# Altium footprint library Supernova Connectors.PcbLib: 303 footprints (part 1 of 19)
Each footprint in its own frame and in the unit in brackets; x right, y up, seen from the top. Pads: shape width x height; smd on the part's side, far side on the other; paste and mask are expansions set on the pad; w line width, h text height; cw(c..) or ccw(c..) is an arc to the next point about the centre after c.
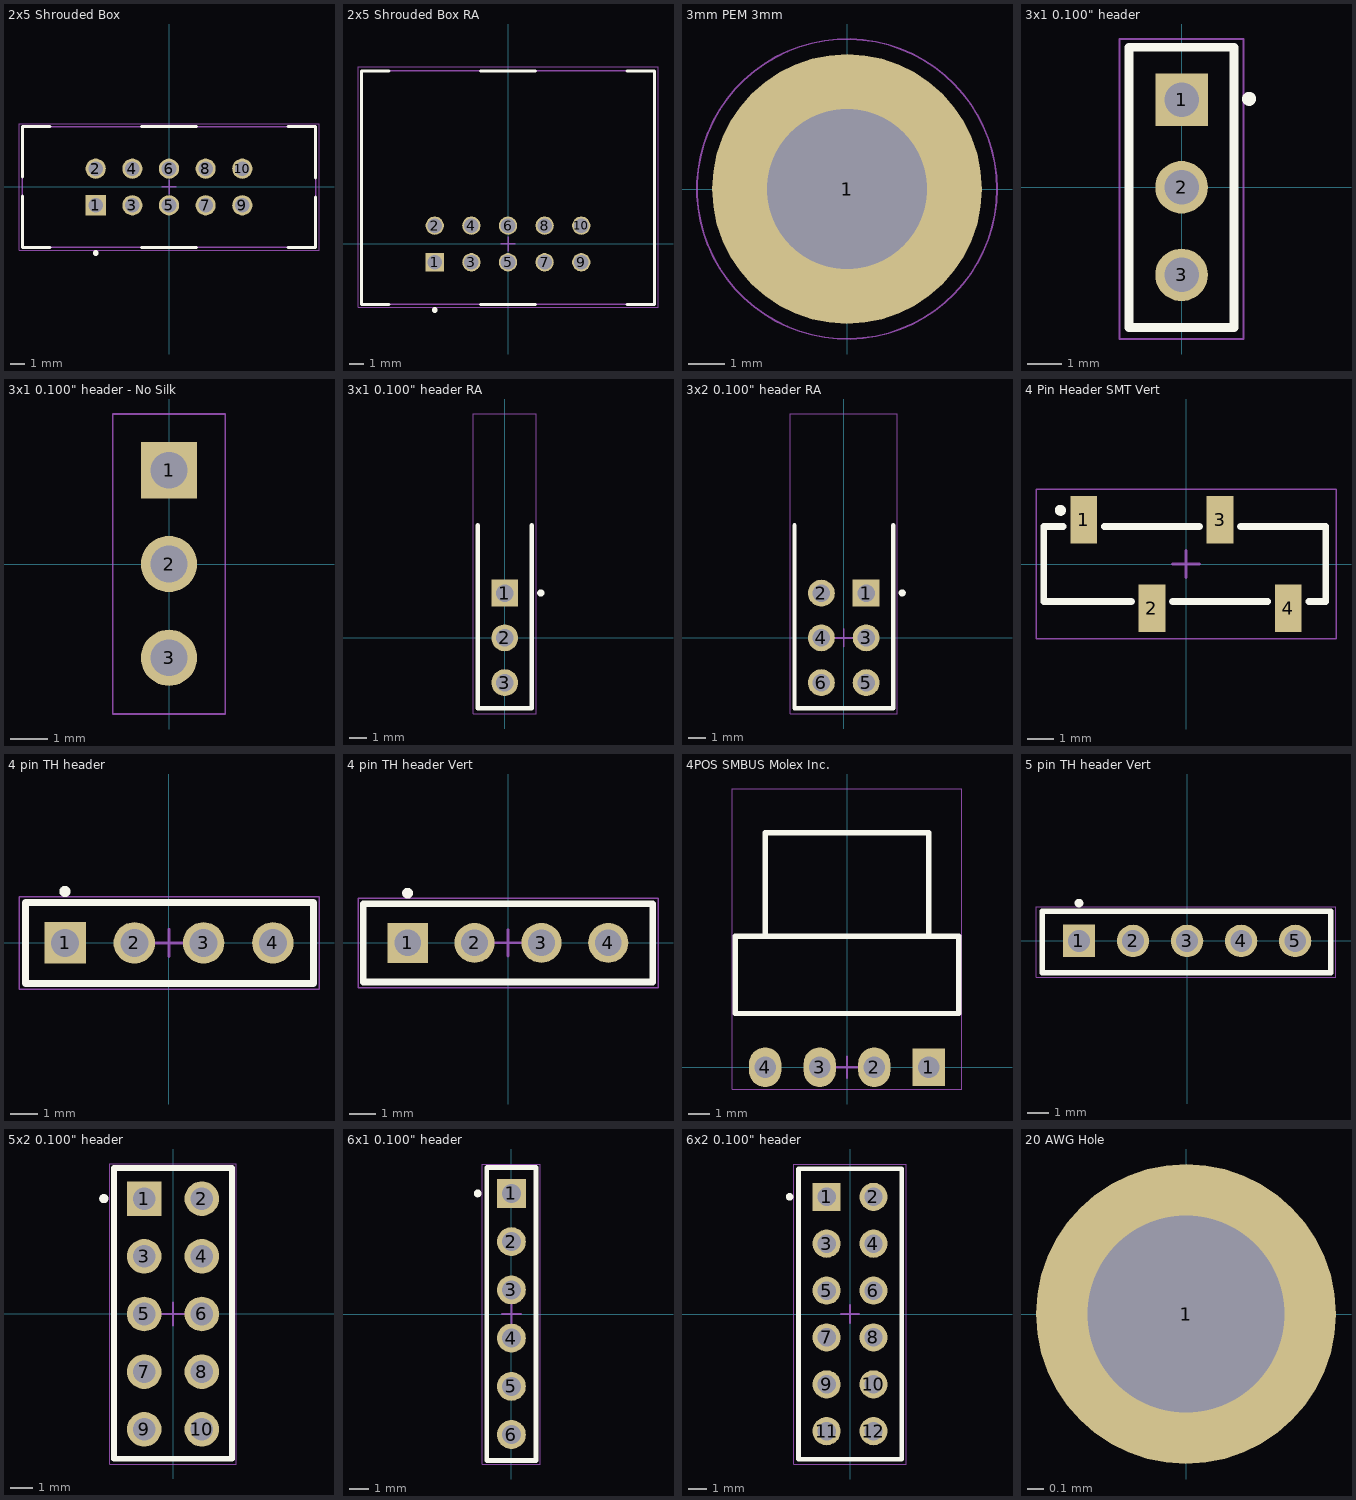
[diagram p0: the footprints below, top view; thin cyan lines are the x and y axes]

## 2x5 Shrouded Box [mm] "2x5 Shrouded Box"
height 10
pads (10):
  rect 1.4x1.4 hole 1.016: 1(-5.08,-1.27)
  round 1.4 hole 1.016: 2(-5.08,1.27) 3(-2.54,-1.27) 4(-2.54,1.27) 5(0,-1.27) 6(0,1.27) 7(2.54,-1.27) 8(2.54,1.27) 9(5.08,-1.27) 10(5.08,1.27)
Top Overlay:
  circle w0.203: c-5.08,-4.578 r0.102
  lines w0.2: -10.16,-0.635 -10.16,-4.191 -8.255,-4.191 ; -10.16,0.7 -10.16,4.191 -8.255,4.191 ; -1.905,-4.191 1.905,-4.191 ; -1.905,4.191 1.905,4.191 ; 8.255,-4.191 10.16,-4.191 10.16,-0.7 ; 8.255,4.191 10.16,4.191 10.16,0.635
Top 3D Body:
  lines w0.1: -10.16,-4.191 -10.16,4.191 10.16,4.191 10.16,-4.191 -10.16,-4.191
Top Courtyard:
  lines w0.05: -10.4,-4.4 -10.4,4.4 10.4,4.4 10.4,-4.4 -10.4,-4.4
  lines w0.1: -0.5,0 0.5,0 ; 0,-0.5 0,0.5
3D body "30310-6002.STEP": height 8.99, standoff -3.08, extent -10.134,-4.318 10.16,4.496

## 2x5 Shrouded Box RA [mil] "2x5 Shrouded Box"
height 393.7
pads (10):
  rect 50x50 hole 40: 1(-200,-50)
  round 50 hole 40: 2(-200,50) 3(-100,-50) 4(-100,50) 5(0,-50) 6(0,50) 7(100,-50) 8(100,50) 9(200,-50) 10(200,50)
Top Overlay:
  circle w8: c-200,-180.24 r4
  lines w7.87: -400,-25 -400,-165 -325,-165 ; -400,-23.62 -400,472.09 -325,472.09 ; -75,-165 75,-165 ; -75,472.09 75,472.09 ; 325,-165 400,-165 400,-27.56 ; 325,472.09 400,472.09 400,-35.43
Top 3D Body:
  lines w3.94: -400,-165 400,-165 400,472.44 -400,472.44 -400,-165
Top Courtyard:
  lines w1.97: -409.45,-173.23 409.45,-173.23 409.45,484.25 -409.45,484.25 -409.45,-173.23
  lines w3.94: -19.68,0 19.69,0 ; 0,-19.69 0,19.68
3D body "30310-5002.stp": height 348, standoff -109, extent -399.5,-62.99 399.5,470.51

## 3mm PEM 3mm [mm]
pads (1):
  round 7.4 / inner round 0 / far side round 5 hole 4.4: 1(0,0)
Top Paste:
  region: 0.4,-3.598 0.4,-2.217 0.398,-2.204 0.563,-2.168 0.884,-2.058 1.185,-1.901 1.459,-1.7 1.699,-1.46 1.9,-1.187 2.057,-0.887 2.167,-0.566 2.204,-0.4 3.613,-0.4 3.59,-0.603 3.5,-1.003 3.365,-1.389 3.188,-1.758 2.971,-2.105 2.716,-2.425 2.426,-2.715 2.106,-2.97 1.76,-3.187 1.391,-3.365 1.004,-3.5 0.605,-3.59 0.402,-3.613
  region: 3.598,0.4 2.217,0.4 2.204,0.398 2.168,0.563 2.058,0.884 1.901,1.185 1.7,1.459 1.46,1.699 1.187,1.9 0.887,2.057 0.566,2.167 0.4,2.204 0.4,3.613 0.603,3.59 1.003,3.5 1.389,3.365 1.758,3.188 2.105,2.971 2.425,2.716 2.715,2.426 2.97,2.106 3.187,1.76 3.365,1.391 3.5,1.004 3.59,0.605 3.613,0.402
  region: -0.4,3.598 -0.4,2.217 -0.398,2.204 -0.563,2.168 -0.884,2.058 -1.185,1.901 -1.459,1.7 -1.699,1.46 -1.9,1.187 -2.057,0.887 -2.167,0.566 -2.204,0.4 -3.613,0.4 -3.59,0.603 -3.5,1.003 -3.365,1.389 -3.188,1.758 -2.971,2.105 -2.716,2.425 -2.426,2.715 -2.106,2.97 -1.76,3.187 -1.391,3.365 -1.004,3.5 -0.605,3.59 -0.402,3.613
  region: -3.598,-0.4 -2.217,-0.4 -2.204,-0.398 -2.168,-0.563 -2.058,-0.884 -1.901,-1.185 -1.7,-1.459 -1.46,-1.699 -1.187,-1.9 -0.887,-2.057 -0.566,-2.167 -0.4,-2.204 -0.4,-3.613 -0.603,-3.59 -1.003,-3.5 -1.389,-3.365 -1.758,-3.188 -2.105,-2.971 -2.425,-2.716 -2.715,-2.426 -2.97,-2.106 -3.187,-1.76 -3.365,-1.391 -3.5,-1.004 -3.59,-0.605 -3.613,-0.402
Top Courtyard:
  circle w0.05: c0,0 r4.115
3D body "Download_STP_9774030960_rev1.stp": height 3, standoff -1.4, extent -3,-3 3,3

## 3x1 0.100" header [mil]
pads (3):
  rect 60x60 hole 39.37: 1(0,100)
  round 60 hole 39.37: 2(0,0) 3(0,-100)
Top Overlay:
  circle w8: c77.07,100.93 r4
  lines w10: -60,-160 60,-160 60,160 -60,160 -60,-160
Top Courtyard:
  lines w1.97: -70.87,-173.23 -70.87,169.29 70.87,169.29 70.87,-173.23 -70.87,-173.23
  lines w3.94: -19.68,0 19.68,0 ; 0,-19.69 0,19.68
3D body "TSW-103-07-G-S.stp": height 330, standoff -100, extent -50,-154.99 50,150.01

## 3x1 0.100" header - No Silk [mil]
pads (3):
  rect 60x60 hole 39.37: 1(0,100)
  round 60 hole 39.37: 2(0,0) 3(0,-100)
Top Courtyard:
  lines w1.97: -60,-160 60,-160 60,160 -60,160 -60,-160
  lines w3.94: -19.68,0 19.69,0 ; 0,-19.68 0,19.68

## 3x1 0.100" header RA [mil]
pads (3):
  rect 60x60 hole 39.37: 1(0,100)
  round 60 hole 39.37: 2(0,0) 3(0,-100)
Top Overlay:
  circle w8: c80.48,100.46 r4
  lines w10: -60,251.97 -60,-157.48 60.74,-157.48 60.74,251.97
Top Courtyard:
  lines w1.97: -70,-170 70,-170 70,500 -70,500 -70,-170
  lines w3.94: -19.68,0 19.68,0 ; 0,-19.69 0,19.68
3D body "TSW-101-08-G-T-RA.stp": height 323.23, standoff -86.77, extent -49.99,-113.44 50.01,489.06

## 3x2 0.100" header RA [mil]
pads (6):
  rect 60x60 hole 39.37: 1(50,100)
  round 60 hole 39.37: 2(-50,100) 3(50,0) 4(-50,0) 5(50,-100) 6(-50,-100)
Top Overlay:
  circle w8: c130.48,100.46 r4
  lines w10: -110,251.97 -110,-157.48 110.74,-157.48 110.74,251.97
Top Courtyard:
  lines w1.97: -120,-170 120,-170 120,500 -120,500 -120,-170
  lines w3.94: -19.68,0 19.68,0 ; 0,-19.69 0,19.68
3D body "TSW-102-08-T-T-RA.stp": height 323.23, standoff -86.77, extent -99.99,-113.44 100.01,489.06

## 4 Pin Header SMT Vert [mm]
pads (4):
  rect 1x1.778 smd paste-0.1: 1(-3.81,1.65) 2(-1.27,-1.65) 3(1.27,1.65) 4(3.81,-1.65)
Top Overlay:
  circle w0.203: c-4.678,2 r0.102
  lines w0.254: -4.572,1.397 -5.3,1.397 -5.3,-1.397 -2.032,-1.397 ; -3.048,1.397 0.508,1.397 ; -0.508,-1.397 3.048,-1.397 ; 2.032,1.397 5.207,1.397 5.207,-1.397 4.572,-1.397
Top Courtyard:
  lines w0.05: -5.588,-2.794 -5.588,2.794 5.588,2.794 5.588,-2.794 -5.588,-2.794
  lines w0.1: -0.5,0 0.5,0 ; 0,-0.5 0,0.5
3D body "10487, NPxC041KFXC-RC.STEP": height 7.5, standoff 0, extent -5.08,-2.132 5.08,2.138

## 4 pin TH header [mil]
pads (4):
  rect 60x60 hole 40.16: 1(-150,0)
  round 60 hole 40.16: 2(-50,0) 3(50,0) 4(150,0)
Top Overlay:
  circle w8: c-150.22,74.33 r4
  lines w10: -207.06,-58.59 -207.06,58.43 208.55,58.43 208.55,-58.59 -207.06,-58.59
Top Courtyard:
  lines w1.97: -216.51,-66.93 216.54,-66.93 216.54,66.93 -216.51,66.93 -216.51,-66.93
  lines w3.94: -19.68,0 19.68,0 ; 0,-19.69 0,19.68
3D body "TSW-104-23-F-S.stp": height 330, standoff -115, extent -205,-50 200,50

## 4 pin TH header Vert [mil]
pads (4):
  rect 60x60 hole 40.16: 1(-150,0)
  round 60 hole 40.16: 2(-50,0) 3(50,0) 4(150,0)
Top Overlay:
  circle w8: c-150.22,74.33 r4
  lines w10: -216.54,-58.59 216.54,-58.59 216.54,58.43 -216.54,58.43 -216.54,-58.59
Top Courtyard:
  lines w1.97: -224.41,-66.93 -224.41,66.93 224.41,66.93 224.41,-66.93 -224.41,-66.93
  lines w3.94: -19.68,0 19.68,0 ; 0,-19.69 0,19.68
3D body "10492, xPxC041LFBN-RC.STEP": height 334.65, standoff -125.98, extent -209.84,-50.79 209.84,49.21

## 4POS SMBUS Molex Inc. [mm] "CONN HEADER 4POS .100 R/A TIN 0022053041"
pads (4):
  rect 1.524x1.75 hole 1 mask+0: 1(3.81,0)
  oval 1.5x1.85 hole 1 mask+0: 2(1.27,0) 3(-1.27,0) 4(-3.81,0)
Top Overlay:
  lines w0.254: 3.81,7.493 3.81,10.16 ; -3.81,6.1 -5.2,6.1 -5.2,2.5 4.024,2.5 5.2,2.5 5.2,6.1 3.81,6.1 ; -3.81,6.1 -3.81,10.909 3.81,10.909 3.81,6.1 ; -3.81,6.1 3.81,6.1
Top Courtyard:
  lines w0.05: -5.334,-1.016 5.334,-1.016 5.334,12.954 -5.334,12.954 -5.334,-1.016
  lines w0.1: -0.5,0 0.5,0 ; 0,-0.5 0,0.5
3D body "022053041.stp": height 6.36, standoff -3.57, extent -5.004,-0.317 5.004,12.611

## 5 pin TH header Vert [mil]
pads (5):
  rect 60x60 hole 40.16: 1(-200,0)
  round 60 hole 40.16: 2(-100,0) 3(0,0) 4(100,0) 5(200,0)
Top Overlay:
  circle w8: c-200,70 r4
  lines w10: -267.72,-59.06 -267.72,55.12 265.62,55.12 265.62,-59.06 -267.72,-59.06
Top Courtyard:
  lines w1.97: -279.53,-66.93 -279.53,62.99 275.59,62.99 275.59,-66.93 -279.53,-66.93
  lines w3.94: -19.68,0 19.68,0 ; 0,-19.68 0,19.69
3D body "10492, xPxC041LFBN-RC.STEP": height 334.65, standoff -125.98, extent -159.84,-50.79 259.84,49.21
3D body "10492, xPxC041LFBN-RC.STEP": height 334.65, standoff -125.98, extent -259.84,-50.79 159.84,49.21

## 5x2 0.100" header [mil]
pads (10):
  rect 60x60 hole 39.37: 1(-50,200)
  round 60 hole 39.37: 2(50,200) 3(-50,100) 4(50,100) 5(-50,0) 6(50,0) 7(-50,-100) 8(50,-100) 9(-50,-200) 10(50,-200)
Top Overlay:
  circle w8: c-120,200 r4
  lines w10: -102.36,-250.79 -102.36,253.15 102.36,253.15 102.36,-250.79 -102.36,-250.79
Top Courtyard:
  lines w1.97: -110,-260 110,-260 110,260 -110,260 -110,-260
  lines w3.94: -19.68,0 19.69,0 ; 0,-19.68 0,19.68
3D body "TSW-105-07-G-D.stp": height 330, standoff -100, extent -100,-249.99 100,250.01

## 6x1 0.100" header [mil]
pads (6):
  rect 60x60 hole 39.37: 1(0,250)
  round 60 hole 39.37: 2(0,150) 3(0,50) 4(0,-50) 5(0,-150) 6(0,-250)
Top Overlay:
  circle w8: c-70,250 r4
  lines w10: -51.18,-303.54 51.18,-303.54 51.18,303.54 -51.18,303.54 -51.18,-303.54
Top Courtyard:
  lines w1.97: -60,-311.02 -60,311.02 60,311.02 60,-311.02 -60,-311.02
  lines w3.94: -19.68,0 19.68,0 ; 0,-19.69 0,19.68
3D body "TSW-103-07-G-S.stp": height 330, standoff -100, extent -50,-304.99 50,0.01
3D body "TSW-103-07-G-S.stp": height 330, standoff -100, extent -50,-4.99 50,300.01

## 6x2 0.100" header [mil]
pads (12):
  rect 60x60 hole 39.37: 1(-50,250)
  round 60 hole 39.37: 2(50,250) 3(-50,150) 4(50,150) 5(-50,50) 6(50,50) 7(-50,-50) 8(50,-50) 9(-50,-150) 10(50,-150) 11(-50,-250) 12(50,-250)
Top Overlay:
  circle w8: c-129.06,250 r4
  lines w10: -110,-310 -100,-310 110,-310 110,310 -110,310 -110,-310
Top Courtyard:
  lines w1.97: -120,-320 120,-320 120,320 -120,320 -120,-320
  lines w3.94: -19.68,0 19.68,0 ; 0,-19.69 0,19.68
3D body "TSW-106-07-G-D_2_14.stp": height 330, standoff -100, extent -100,-300 100,300

## 20 AWG Hole [mil]
pads (1):
  round 70 hole 46: 1(0,0)